# Altium footprint library myPcbLib.PcbLib: 987 footprints (part 7 of 62)
Each footprint in its own frame and in the unit in brackets; x right, y up, seen from the top. Pads: shape width x height; smd on the part's side, far side on the other; paste and mask are expansions set on the pad; w line width, h text height; cw(c..) or ccw(c..) is an arc to the next point about the centre after c.
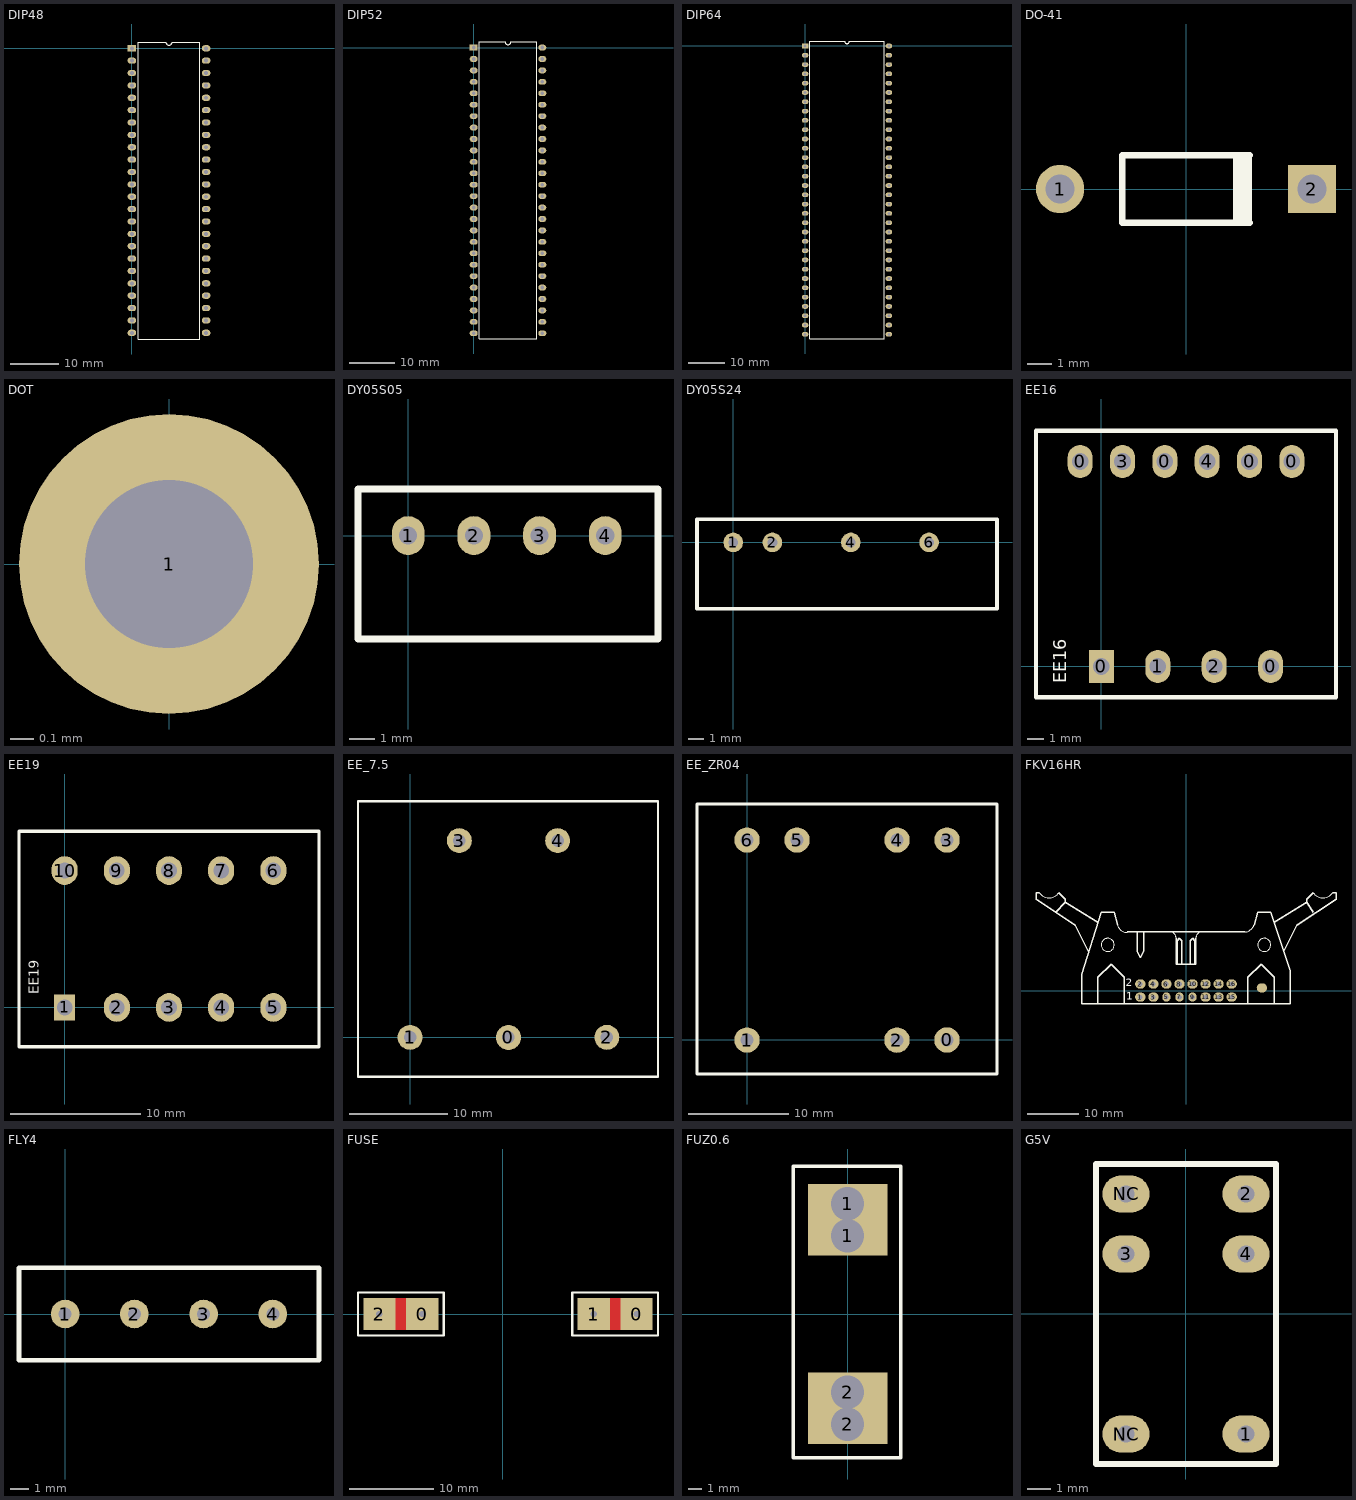
[diagram p6: the footprints below, top view; thin cyan lines are the x and y axes]

## DIP48 [mil]
pads (48):
  rect 70x50 hole 32: 1(0,0)
  oval 70x50 hole 32: 2(0,-100) 3(0,-200) 4(0,-300) 5(0,-400) 6(0,-500) 7(0,-600) 8(0,-700) 9(0,-800) 10(0,-900) 11(0,-1000) 12(0,-1100) 13(0,-1200) 14(0,-1300) 15(0,-1400) 16(0,-1500) 17(0,-1600) 18(0,-1700) 19(0,-1800) 20(0,-1900) 21(0,-2000) 22(0,-2100) 23(0,-2200) 24(0,-2300) 25(600,-2300) 26(600,-2200) 27(600,-2100) 28(600,-2000) 29(600,-1900) 30(600,-1800) 31(600,-1700) 32(600,-1600) 33(600,-1500) 34(600,-1400) 35(600,-1300) 36(600,-1200) 37(600,-1100) 38(600,-1000) 39(600,-900) 40(600,-800) 41(600,-700) 42(600,-600) 43(600,-500) 44(600,-400) 45(600,-300) 46(600,-200) 47(600,-100) 48(600,0)
Top Overlay:
  lines w10: 50,-2350 550,-2350 550,50 325,50 cw(c300,50) 275,50 50,50 50,-2350

## DIP52 [mil]
pads (52):
  rect 70x50 hole 32: 1(0,0)
  oval 70x50 hole 32: 2(0,-100) 3(0,-200) 4(0,-300) 5(0,-400) 6(0,-500) 7(0,-600) 8(0,-700) 9(0,-800) 10(0,-900) 11(0,-1000) 12(0,-1100) 13(0,-1200) 14(0,-1300) 15(0,-1400) 16(0,-1500) 17(0,-1600) 18(0,-1700) 19(0,-1800) 20(0,-1900) 21(0,-2000) 22(0,-2100) 23(0,-2200) 24(0,-2300) 25(0,-2400) 26(0,-2500) 27(600,-2500) 28(600,-2400) 29(600,-2300) 30(600,-2200) 31(600,-2100) 32(600,-2000) 33(600,-1900) 34(600,-1800) 35(600,-1700) 36(600,-1600) 37(600,-1500) 38(600,-1400) 39(600,-1300) 40(600,-1200) 41(600,-1100) 42(600,-1000) 43(600,-900) 44(600,-800) 45(600,-700) 46(600,-600) 47(600,-500) 48(600,-400) 49(600,-300) 50(600,-200) 51(600,-100) 52(600,0)
Top Overlay:
  lines w10: 50,-2550 50,50 275,50 ccw(c300,50) 325,50 550,50 550,-2550 50,-2550

## DIP64 [mil]
pads (64):
  rect 70x50 hole 32: 1(0,0)
  oval 70x50 hole 32: 2(0,-100) 3(0,-200) 4(0,-300) 5(0,-400) 6(0,-500) 7(0,-600) 8(0,-700) 9(0,-800) 10(0,-900) 11(0,-1000) 12(0,-1100) 13(0,-1200) 14(0,-1300) 15(0,-1400) 16(0,-1500) 17(0,-1600) 18(0,-1700) 19(0,-1800) 20(0,-1900) 21(0,-2000) 22(0,-2100) 23(0,-2200) 24(0,-2300) 25(0,-2400) 26(0,-2500) 27(0,-2600) 28(0,-2700) 29(0,-2800) 30(0,-2900) 31(0,-3000) 32(0,-3100) 33(900,-3100) 34(900,-3000) 35(900,-2900) 36(900,-2800) 37(900,-2700) 38(900,-2600) 39(900,-2500) 40(900,-2400) 41(900,-2300) 42(900,-2200) 43(900,-2100) 44(900,-2000) 45(900,-1900) 46(900,-1800) 47(900,-1700) 48(900,-1600) 49(900,-1500) 50(900,-1400) 51(900,-1300) 52(900,-1200) 53(900,-1100) 54(900,-1000) 55(900,-900) 56(900,-800) 57(900,-700) 58(900,-600) 59(900,-500) 60(900,-400) 61(900,-300) 62(900,-200) 63(900,-100) 64(900,0)
Top Overlay:
  lines w10: 50,-3150 850,-3150 850,50 475,50 cw(c450,50) 425,50 50,50 50,-3150

## DO-41 [mm] "Diode, Axial; Body 5.2 x 2.7 mm (LxDia. max), Lead Dia. 0.86 mm (max)"
height 2.8
pads (2):
  round 2 hole 1.2: 1(-5.23,0)
  rect 2x2 hole 1.2: 2(5.23,0)
Top Overlay:
  rectangle: 1.95,-1.4 2.75,1.4
  lines w0.254: 2.65,-1.4 -2.65,-1.4 -2.65,1.4 2.65,1.4

## DOT [mil]
pads (1):
  round 50 hole 28: 1(0,0)

## DY05S05 [mm]
pads (4):
  oval 1.27x1.5 hole 0.7: 1(0,0) 2(2.54,0) 3(5.08,0) 4(7.62,0)
Top Overlay:
  lines w0.254: -1.94,-4 9.66,-4 9.66,1.8 -1.94,1.8 -1.94,-4

## DY05S24 [mm]
height 15
pads (4):
  round 1.27 hole 0.635: 1(0,0) 2(2.54,0) 4(7.62,0) 6(12.7,0)
Top Overlay:
  lines w0.254: -2.35,-4.3 -2.35,1.5 17.1,1.5 17.1,-4.3 -2.35,-4.3

## EE16 [mm]
pads (10):
  oval 1.5x2 hole 1: 0(-1.27,12.3) 0(3.81,12.3) 0(8.89,12.3) 0(10.16,0) 0(11.43,12.3) 1(3.386,0) 2(6.774,0) 3(1.27,12.3) 4(6.35,12.3)
  rect 1.5x2 hole 1: 0(0,0)
Top Overlay:
  lines w0.254: -3.92,-1.85 14.08,-1.85 14.08,14.15 -3.92,14.15 -3.92,-1.85
  text "EE16" at -2.1,-1 h0.76

## EE19 [mm]
pads (10):
  rect 1.6x2 hole 1.2: 1(0,0)
  oval 2x2.2 hole 1.2: 2(4,0) 3(8,0) 4(12,0) 5(16,0) 6(16,10.5) 7(12,10.5) 8(8,10.5) 9(4,10.5) 10(0,10.5)
Top Overlay:
  lines w0.254: -3.5,-3 19.5,-3 19.5,13.5 -3.5,13.5 -3.5,-3
  text "EE19" at -2,1 h0.76

## EE_7.5 [mm]
height 25
pads (5):
  round 2.54 hole 1.27: 0(9.999,-0.011) 1(0,0) 2(19.999,0.004) 3(5,20) 4(15,20)
Top Overlay:
  lines w0.254: -5.3,-4 25.2,-4 25.2,24 -5.3,24 -5.3,-4

## EE_ZR04 [mm]
pads (7):
  round 2.54 hole 1.27: 0(20,0) 1(0.001,-0.004) 2(15,-0.015) 3(20.001,19.996) 4(15.001,19.996) 5(5.001,19.996) 6(0.001,19.996)
Top Overlay:
  lines w0.254: -5,-3.4 25,-3.4 25,23.6 -5,23.6 -5,-3.4

## FKV16HR [mm]
pads (18):
  oval 2x1.8 hole 0.889: 1(-8.89,-1.27) 2(-8.89,1.27) 3(-6.35,-1.27) 4(-6.35,1.27) 6(-3.81,1.27) 8(-1.27,1.27) 10(1.27,1.27) 11(3.81,-1.27) 12(3.81,1.27) 13(6.35,-1.27) 14(6.35,1.27) 15(8.89,-1.27) 16(8.89,1.27)
  oval 1.6x1.8 hole 0.889: 5(-3.81,-1.27) 7(-1.27,-1.27) 9(1.27,-1.27)
  oval 2x1.8 all layers, no hole: BO1(14.774,0.508)
  round 0 all layers, no hole: BO2(-14.774,0.508)
Top Overlay:
  circle w0.203: c15.24,8.89 r1.27
  circle w0.203: c-15.24,8.89 r1.27
  lines w0.203: -28.565,19.042 ccw(c-26.67,20.32) -24.775,19.042 ; -13.342,12.714 ccw(c-11.43,13.335) -11.43,11.324 ; -3.175,11.43 cw(c-3.175,10.16) -1.905,10.16 ; 1.905,10.16 cw(c3.175,10.16) 3.175,11.43 ; 11.43,11.43 ccw(c11.43,13.335) 13.242,12.746 ; 24.775,19.042 ccw(c26.67,20.32) 28.565,19.042
  lines w0.254: -28.575,19.05 -29.21,19.05 -29.21,17.78 -21.59,12.7 -19.05,7.62 ; -25.4,15.24 -23.495,17.145 ; -24.765,19.05 -23.495,17.78 -23.495,17.145 ; -17.145,-2.54 -17.145,2.54 -14.605,5.08 -12.065,2.54 -12.065,-2.54 ; -17.145,13.335 -23.495,17.145 ; -13.335,12.7 -13.97,15.24 -16.51,15.24 -20.32,3.175 -20.32,-2.54 20.32,-2.54 20.32,3.81 16.51,15.24 13.97,15.24 13.335,12.7 ; -11.43,11.43 11.43,11.43 ; -9.525,11.43 -9.525,7.62 -8.89,6.35 -8.255,7.62 -8.255,11.43 ; -1.905,10.16 -1.905,5.08 1.905,5.08 1.905,10.16 ; -1.693,5.08 -1.693,9.737 -1.27,10.16 -0.847,9.737 -0.847,5.08 ; 0.847,5.08 0.847,9.737 1.27,10.16 1.693,9.737 1.693,5.08 ; 12.065,-2.54 12.065,2.54 14.605,5.08 17.145,2.54 17.145,-2.54 ; 17.145,13.335 23.495,17.145 ; 19.05,7.62 21.59,12.7 29.21,17.78 29.21,19.05 28.575,19.05 ; 24.765,15.24 23.495,17.145 ; 24.765,19.05 23.495,17.78 23.495,17.145
  text "1" at -11.659,-1.829 h1.52
  text "2" at -11.735,0.864 h1.52

## FLY4 [mil]
pads (4):
  round 62 hole 28: 1(0,0) 2(150,0) 3(300,0) 4(450,0)
Top Overlay:
  lines w10: -100,-100 -100,100 550,100 550,-100 -100,-100

## FUSE [mil]
pads (4):
  rect 150x150 hole 30: 0(-375,0) 0(625,0) 1(425,0) 2(-575,0)
Top Layer:
  rectangle: 475,-75 575,75
  rectangle: -525,-75 -425,75
Bottom Layer:
  rectangle: 475,-75 575,75
  rectangle: -525,-75 -425,75
Top Overlay:
  lines w10: -675,-100 -675,100 -275,100 -275,-100 -675,-100 ; 325,-100 325,100 725,100 725,-100 325,-100

## FUZ0.6 [mm]
pads (4):
  rect 6x3 hole 2.5: 1(0,5.905) 1(0,8.319) 2(0,-8.319) 2(0,-5.905)
Top Overlay:
  lines w0.254: -4.114,-10.843 -4.114,11.158 ; -4.064,-10.858 3.936,-10.858 ; -4.064,11.158 3.936,11.158 ; 4.014,-10.843 4.014,11.158

## G5V [mil]
height 393.7
pads (6):
  oval 78.74x62 hole 28: 1(100,-200) 2(100,200) 3(-100,100) 4(100,100) NC(-100,-200) NC(-100,200)
Top Overlay:
  lines w10: -150,-250 -150,250 150,250 150,-250 -150,-250